# Altium footprint library WARG.PcbLib: 58 footprints (part 3 of 4)
Each footprint in its own frame and in the unit in brackets; x right, y up, seen from the top. Pads: shape width x height; smd on the part's side, far side on the other; paste and mask are expansions set on the pad; w line width, h text height; cw(c..) or ccw(c..) is an arc to the next point about the centre after c.
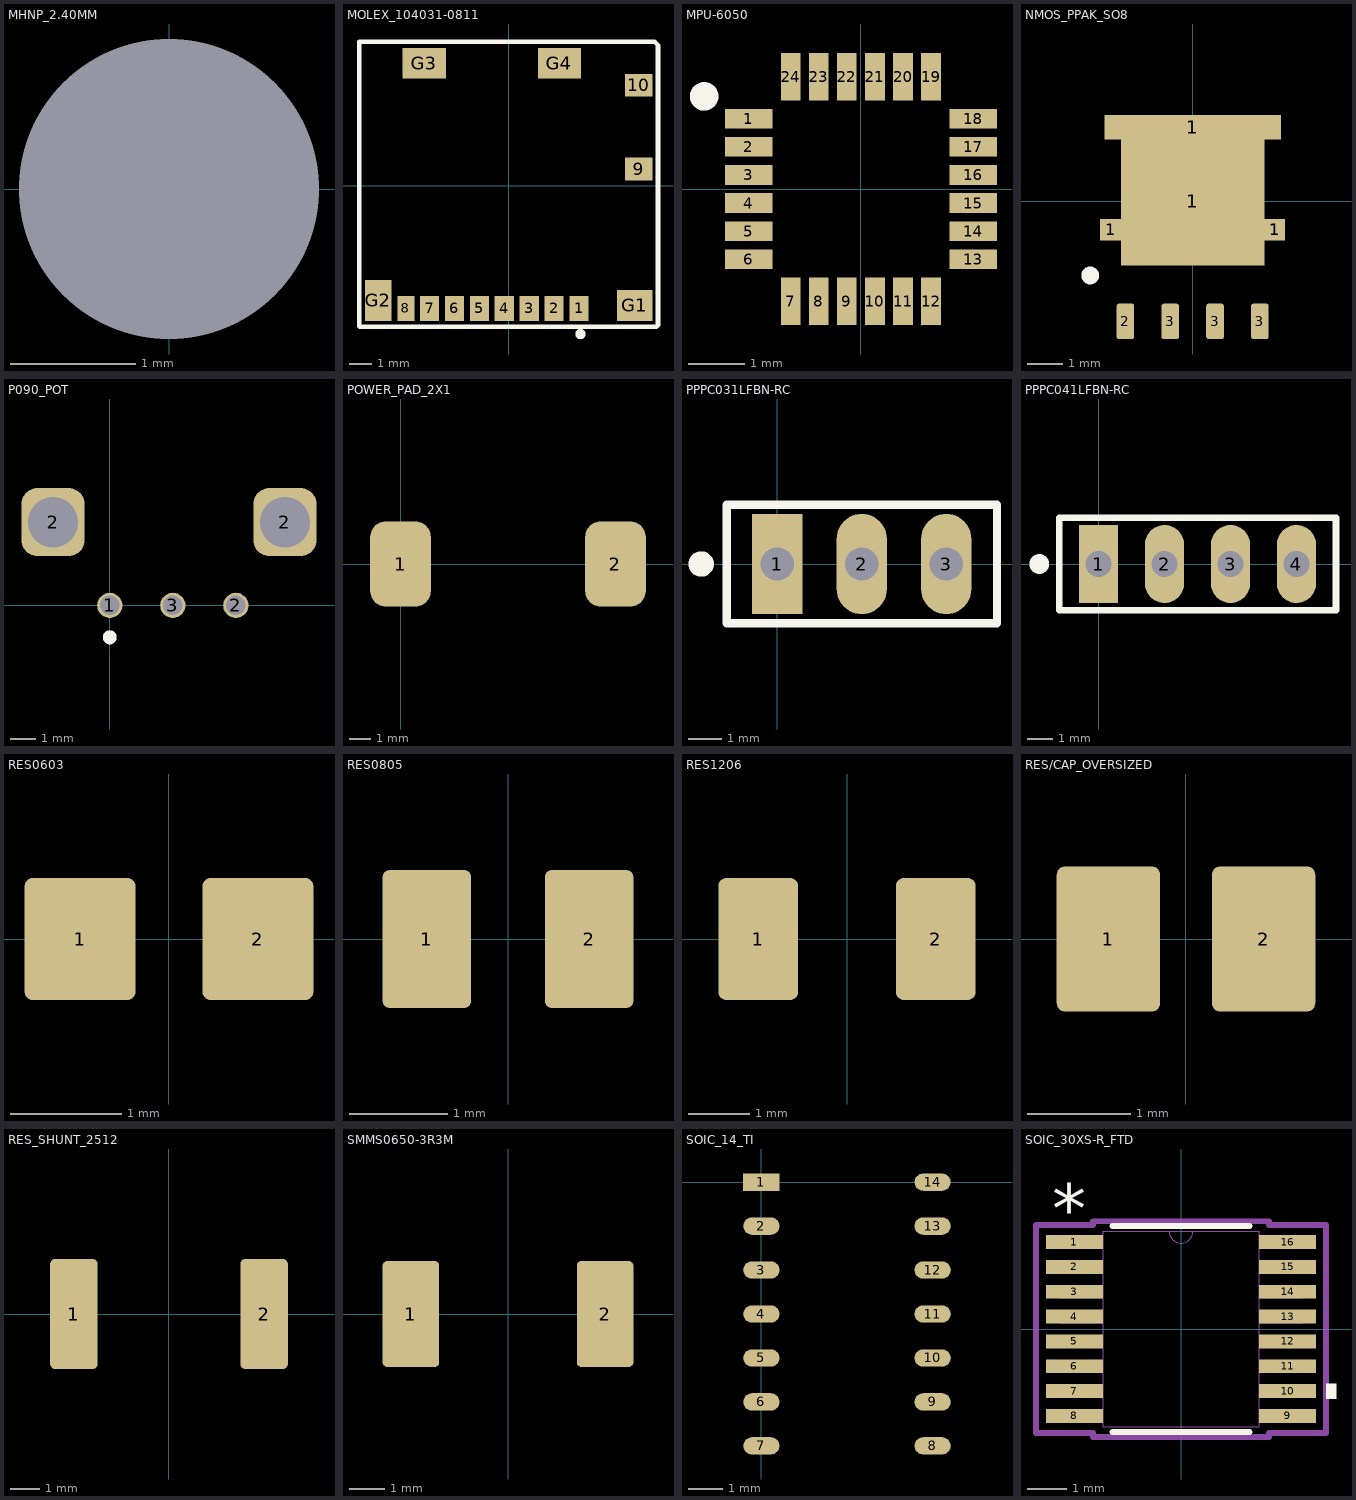
[diagram p2: the footprints below, top view; thin cyan lines are the x and y axes]

## MHNP_2.40MM [mm] "Mounting Hole Non-plated Diameter 2.40mm"
pads (1):
  round 0 hole 2.4: 1(0,0)

## MOLEX_104031-0811 [mm]
pads (14):
  rect 0.85x1.1 smd: 1(3.113,-5.412) 2(2.013,-5.412) 3(0.913,-5.412) 4(-0.188,-5.412) 5(-1.288,-5.412) 6(-2.387,-5.412) 7(-3.487,-5.412)
  rect 0.75x1.1 smd: 8(-4.537,-5.412)
  rect 1.2x1 smd: 9(5.748,0.738) 10(5.748,4.437)
  rect 1.55x1.35 smd: G1(5.573,-5.288)
  rect 1.17x1.8 smd: G2(-5.747,-5.062)
  rect 1.9x1.35 smd: G3(-3.722,5.413) G4(2.248,5.413)
Top Overlay:
  circle w0.25: c3.175,-6.55 r0.1
  lines w0.2: -6.6,-6.2 -6.6,-5.875 -6.6,5.95 -6.6,6.35 -5.65,6.35 2.325,6.35 5.525,6.35 6.45,6.35 6.6,6.2 6.6,5.612 6.6,-5.95 6.6,-6.15 6.525,-6.225 6.014,-6.225 -6.35,-6.225 -6.575,-6.225
3D body "104031-0811.stp": height 1.46, standoff 0.01, extent -5.967,-5.55 5.983,5.85

## MPU-6050 [mm]
pads (24):
  rect 0.85x0.35 smd: 1(-2,1.25) 2(-2,0.75) 3(-2,0.25) 4(-2,-0.25) 5(-2,-0.75) 6(-2,-1.25) 13(2,-1.25) 14(2,-0.75) 15(2,-0.25) 16(2,0.25) 17(2,0.75) 18(2,1.25)
  rect 0.35x0.85 smd: 7(-1.25,-2) 8(-0.75,-2) 9(-0.25,-2) 10(0.25,-2) 11(0.75,-2) 12(1.25,-2) 19(1.25,2) 20(0.75,2) 21(0.25,2) 22(-0.25,2) 23(-0.75,2) 24(-1.25,2)
Top Overlay:
  circle w0.254: c-2.794,1.651 r0.127
3D body "QFN24_4X4X0P9_IVS.step": height 0.94, standoff 0, extent -2.045,-2.045 2.045,2.045

## NMOS_PPAK_SO8 [mm]
pads (9):
  rect 0.595x0.61 smd mask+0.102: 1(-2.323,-0.803) 1(2.323,-0.803) 1(2.323,-0.803)
  rect 4.061x3.63 smd mask+0.102: 1(0,0)
  rect 5x0.7 smd: 1(0,2.1)
  rrect25% 0.5x1 smd: 2(-1.905,-3.4) 3(-0.635,-3.4) 3(0.635,-3.4) 3(1.905,-3.4)
Top Overlay:
  circle w0.3: c-2.905,-2.1 r0.1
3D body "User Library-PowerPAK_SO-8L_SINGLE.STEP": height 1.08, standoff 0.01, extent -2.56,-3.755 2.56,2.395

## P090_POT [mm]
pads (5):
  round 1 hole 0.762: 1(0,0) 2(5,0) 3(2.5,0)
  rrect50% 2.5x2.7 hole 2 square: 2(-2.25,3.3) 2(6.95,3.3)
Top Overlay:
  circle w0.35: c0,-1.27 r0.102

## POWER_PAD_2X1 [mm]
pads (2):
  rrect50% 2.82x3.96 smd: 1(0,0) 2(10,0)

## PPPC031LFBN-RC [mm] "3 Pin Female Header"
pads (3):
  rect 1.508x3.016 hole 1: 1(0,0)
  oval 1.508x3.016 hole 1: 2(2.54,0) 3(5.08,0)
Top Overlay:
  circle w0.508: c-2.286,0 r0.127
  lines w0.254: -1.524,-1.778 6.604,-1.778 6.604,1.778 -1.524,1.778 -1.524,-1.778
3D body "PPPC031LFBN-RC.stp": height 8.53, standoff -3.47, extent -1.52,-1.27 6.6,1.27

## PPPC041LFBN-RC [mm] "4 Pin Female Header"
pads (4):
  rect 1.508x3.016 hole 1: 1(0,0)
  oval 1.508x3.016 hole 1: 2(2.54,0) 3(5.08,0) 4(7.62,0)
Top Overlay:
  circle w0.508: c-2.286,0 r0.127
  lines w0.254: -1.524,-1.778 -1.524,1.778 9.144,1.778 9.144,-1.778 -1.524,-1.778
3D body "PPPC041LFBN-RC.stp": height 8.53, standoff -3.47, extent -1.52,-1.27 9.14,1.27

## RES0603 [mm] "SMT Resistor 0603"
height 0.6
pads (2):
  rrect15% 1x1.1 smd: 1(-0.8,0) 2(0.8,0)
3D body "0603.step": height 0.46, standoff 0.01, extent -0.8,-0.4 0.8,0.4

## RES0805 [mm] "SMT Resistor 0805"
height 0.5
pads (2):
  rrect15% 0.9x1.4 smd: 1(-0.825,0) 2(0.825,0)
3D body "0805 resistor.step": height 0.61, standoff 0.01, extent -1,-0.625 1,0.625

## RES1206 [mm] "SMT Resistor 1206"
height 0.75
pads (2):
  rrect20% 1.3x2 smd: 1(-1.45,0) 2(1.45,0)
3D body "1206 resistor.step": height 0.61, standoff 0.01, extent -1.6,-0.8 1.6,0.8

## RES/CAP_OVERSIZED [mm]
pads (2):
  rrect15% 1x1.4 smd: 1(-0.75,0) 2(0.75,0)

## RES_SHUNT_2512 [mm]
pads (2):
  rrect20% 1.6x3.7 smd: 1(-3.2,0) 2(3.2,0)
3D body "CircuitWorks-RESISTOR 2512.step": height 0.59, standoff -0.02, extent -3.175,-1.63 3.175,1.63

## SMMS0650-3R3M [mm] "IND 3.3UH 8.5A 22M OHM"
pads (2):
  rrect15% 1.6x3 smd: 1(-2.75,0) 2(2.75,0)
3D body: height 5, standoff 0, extent -3.55,-3.3 3.55,3.3

## SOIC_14_TI [mm]
pads (14):
  rect 1.05x0.5 smd: 1(0,0)
  oval 1.05x0.5 smd: 2(0,-1.27) 3(0,-2.54) 4(0,-3.81) 5(0,-5.08) 6(0,-6.35) 7(0,-7.62) 8(4.95,-7.62) 9(4.95,-6.35) 10(4.95,-5.08) 11(4.95,-3.81) 12(4.95,-2.54) 13(4.95,-1.27) 14(4.95,0)
3D body "SOIC-14_3.9x8.7mm_P1.27mm.step": height 1.75, standoff 0, extent -0.536,-8.135 5.464,0.565

## SOIC_30XS-R_FTD [mil]
pads (16):
  rect 57.5x14 smd paste+0 mask+0: 1(-107.25,87.5) 2(-107.25,62.5) 3(-107.25,37.5) 4(-107.25,12.5) 5(-107.25,-12.5) 6(-107.25,-37.5) 7(-107.25,-62.5) 8(-107.25,-87.5) 9(107.25,-87.5) 10(107.25,-62.5) 11(107.25,-37.5) 12(107.25,-12.5) 13(107.25,12.5) 14(107.25,37.5) 15(107.25,62.5) 16(107.25,87.5)
Top Overlay:
  region: 146,-55 156,-55 156,-70 146,-70
  lines w6: -68.98,-103.5 68.98,-103.5 ; -68.98,103.5 68.98,103.5
  text "*" at -129.75,96.5 h50
Mechanical 13:
  lines w0: -12,98.5 ccw(c0,98.5) 12,98.5
  lines w1: -122,-93.5 -78.5,-93.5 -78.5,-81.5 -122,-81.5 -122,-93.5 ; -122,-68.5 -78.5,-68.5 -78.5,-56.5 -122,-56.5 -122,-68.5 ; -122,-43.5 -78.5,-43.5 -78.5,-31.5 -122,-31.5 -122,-43.5 ; -122,-18.5 -78.5,-18.5 -78.5,-6.5 -122,-6.5 -122,-18.5 ; -122,6.5 -78.5,6.5 -78.5,18.5 -122,18.5 -122,6.5 ; -122,31.5 -78.5,31.5 -78.5,43.5 -122,43.5 -122,31.5 ; -122,56.5 -78.5,56.5 -78.5,68.5 -122,68.5 -122,56.5 ; -122,81.5 -78.5,81.5 -78.5,93.5 -122,93.5 -122,81.5 ; -78.5,-98.5 -78.5,98.5 78.5,98.5 78.5,-98.5 -78.5,-98.5 ; 78.5,-93.5 122,-93.5 122,-81.5 78.5,-81.5 78.5,-93.5 ; 78.5,-68.5 122,-68.5 122,-56.5 78.5,-56.5 78.5,-68.5 ; 78.5,-43.5 122,-43.5 122,-31.5 78.5,-31.5 78.5,-43.5 ; 78.5,-18.5 122,-18.5 122,-6.5 78.5,-6.5 78.5,-18.5 ; 78.5,6.5 122,6.5 122,18.5 78.5,18.5 78.5,6.5 ; 78.5,31.5 122,31.5 122,43.5 78.5,43.5 78.5,31.5 ; 78.5,56.5 122,56.5 122,68.5 78.5,68.5 78.5,56.5 ; 78.5,81.5 122,81.5 122,93.5 78.5,93.5 78.5,81.5
  text "*" at -76,45.5 h50
Mechanical 15:
  lines w6: -146,-104.5 -88.5,-104.5 -88.5,-108.5 88.5,-108.5 88.5,-104.5 146,-104.5 146,104.5 88.5,104.5 88.5,108.5 -88.5,108.5 -88.5,104.5 -146,104.5 -146,-104.5
3D body "SOIC_30XS-R_FTD.step": height 69.09, standoff 0, extent -122.01,-98.5 122.01,98.5